# Altium schematic symbol library jlcpcb_2025_04_capacitors_extended_0805.schlib: 3281 symbols (part 2 of 18) (continued)
## 0805B561K101NT (continued)

## 0805B561K500CT
designator C?  Capacitance: 560pF  (hidden comment: *)
Capacitor, Ceramic (MLCC), 560pF, ±10%, 50V, X7R, ±10%, SMD 0805; Manufacturer: Walsin Tech Corp; Manufacturer Part Number: 0805B561K500CT; Package Size: 0805; JLCPCB Basic Part: No; JLCPCB Part Number: C123625; Supplier 1: LCSC; Category: Capacitors - MLCC; Supplier Part Number 1: C123625; Tolerance: ±10%; Voltage Rating: 50V; Temperature Coefficient: X7R; RoHS: Yes; ComponentLink1Description: Datasheet; ComponentLink1URL: https://wmsc.lcsc.com/wmsc/upload/file/pdf/v2/lcsc/2304140030_Walsin-Tech-Corp-0805B561K500CT_C123625.pdf; ComponentLink2Description: JLCPCB Part URL; ComponentLink2URL: https://jlcpcb.com/partdetail/C123625; ComponentLink3Description: LCSC Part URL; ComponentLink3URL: https://lcsc.com/product-detail/Multilayer-Ceramic-Capacitors-MLCC---SMD-SMT_Walsin-Tech-Corp-Walsin-Tech-Corp-0805B561K500CT_C123625.html
footprint CAP-0805 (0805 (2012M) Capacitor)
pins: 1, 2

## 0805B561K500NT
designator C?  Capacitance: 560pF  (hidden comment: *)
Capacitor, Ceramic (MLCC), 560pF, ±10%, 50V, X7R, ±10%, SMD 0805; Manufacturer: FH(Guangdong Fenghua Advanced Tech); Manufacturer Part Number: 0805B561K500NT; Package Size: 0805; JLCPCB Basic Part: No; JLCPCB Part Number: C1751; Supplier 1: LCSC; Category: Capacitors - MLCC; Supplier Part Number 1: C1751; Tolerance: ±10%; Voltage Rating: 50V; Temperature Coefficient: X7R; RoHS: Yes; ComponentLink1Description: Datasheet; ComponentLink1URL: https://wmsc.lcsc.com/wmsc/upload/file/pdf/v2/lcsc/2304140030_FH--Guangdong-Fenghua-Advanced-Tech-0805B561K500NT_C1751.pdf; ComponentLink2Description: JLCPCB Part URL; ComponentLink2URL: https://jlcpcb.com/partdetail/C1751; ComponentLink3Description: LCSC Part URL; ComponentLink3URL: https://lcsc.com/product-detail/Multilayer-Ceramic-Capacitors-MLCC---SMD-SMT_FH-Guangdong-Fenghua-Advanced-Tech-FH-Guangdong-Fenghua-Advanced-Tech-0805B561K500NT_C1751.html
footprint CAP-0805 (0805 (2012M) Capacitor)
pins: 1, 2

## 0805B562K101NT
designator C?  Capacitance: 5.6nF  (hidden comment: *)
Capacitor, Ceramic (MLCC), 5.6nF, ±10%, 100V, X7R, ±10%, SMD 0805; Manufacturer: FH(Guangdong Fenghua Advanced Tech); Manufacturer Part Number: 0805B562K101NT; Package Size: 0805; JLCPCB Basic Part: No; JLCPCB Part Number: C56078; Supplier 1: LCSC; Category: Capacitors - MLCC; Supplier Part Number 1: C56078; Tolerance: ±10%; Voltage Rating: 100V; Temperature Coefficient: X7R; RoHS: Yes; ComponentLink1Description: Datasheet; ComponentLink1URL: https://wmsc.lcsc.com/wmsc/upload/file/pdf/v2/lcsc/2304140030_FH--Guangdong-Fenghua-Advanced-Tech-0805B562K101NT_C56078.pdf; ComponentLink2Description: JLCPCB Part URL; ComponentLink2URL: https://jlcpcb.com/partdetail/C56078; ComponentLink3Description: LCSC Part URL; ComponentLink3URL: https://lcsc.com/product-detail/Multilayer-Ceramic-Capacitors-MLCC---SMD-SMT_FH-Guangdong-Fenghua-Advanced-Tech-FH-Guangdong-Fenghua-Advanced-Tech-0805B562K101NT_C56078.html
footprint CAP-0805 (0805 (2012M) Capacitor)
pins: 1, 2

## 0805B562K251CT
designator C?  Capacitance: 5.6nF  (hidden comment: *)
Capacitor, Ceramic (MLCC), 5.6nF, ±10%, 250V, X7R, ±10%, SMD 0805; Manufacturer: Walsin Tech Corp; Manufacturer Part Number: 0805B562K251CT; Package Size: 0805; JLCPCB Basic Part: No; JLCPCB Part Number: C152983; Supplier 1: LCSC; Category: Capacitors - MLCC; Supplier Part Number 1: C152983; Tolerance: ±10%; Voltage Rating: 250V; Temperature Coefficient: X7R; RoHS: Yes; ComponentLink1Description: Datasheet; ComponentLink1URL: https://wmsc.lcsc.com/wmsc/upload/file/pdf/v2/lcsc/2304140030_Walsin-Tech-Corp-0805B562K251CT_C152983.pdf; ComponentLink2Description: JLCPCB Part URL; ComponentLink2URL: https://jlcpcb.com/partdetail/C152983; ComponentLink3Description: LCSC Part URL; ComponentLink3URL: https://lcsc.com/product-detail/Multilayer-Ceramic-Capacitors-MLCC---SMD-SMT_Walsin-Tech-Corp-Walsin-Tech-Corp-0805B562K251CT_C152983.html
footprint CAP-0805 (0805 (2012M) Capacitor)
pins: 1, 2

## 0805B562K500CT
designator C?  Capacitance: 5.6nF  (hidden comment: *)
Capacitor, Ceramic (MLCC), 5.6nF, ±10%, 50V, X7R, ±10%, SMD 0805; Manufacturer: Walsin Tech Corp; Manufacturer Part Number: 0805B562K500CT; Package Size: 0805; JLCPCB Basic Part: No; JLCPCB Part Number: C152866; Supplier 1: LCSC; Category: Capacitors - MLCC; Supplier Part Number 1: C152866; Tolerance: ±10%; Voltage Rating: 50V; Temperature Coefficient: X7R; RoHS: Yes; ComponentLink1Description: Datasheet; ComponentLink1URL: https://wmsc.lcsc.com/wmsc/upload/file/pdf/v2/lcsc/2304140030_Walsin-Tech-Corp-0805B562K500CT_C152866.pdf; ComponentLink2Description: JLCPCB Part URL; ComponentLink2URL: https://jlcpcb.com/partdetail/C152866; ComponentLink3Description: LCSC Part URL; ComponentLink3URL: https://lcsc.com/product-detail/Multilayer-Ceramic-Capacitors-MLCC---SMD-SMT_Walsin-Tech-Corp-Walsin-Tech-Corp-0805B562K500CT_C152866.html
footprint CAP-0805 (0805 (2012M) Capacitor)
pins: 1, 2

## 0805B562K500NT
designator C?  Capacitance: 5.6nF  (hidden comment: *)
Capacitor, Ceramic (MLCC), 5.6nF, ±10%, 50V, X7R, ±10%, SMD 0805; Manufacturer: FH(Guangdong Fenghua Advanced Tech); Manufacturer Part Number: 0805B562K500NT; Package Size: 0805; JLCPCB Basic Part: No; JLCPCB Part Number: C1752; Supplier 1: LCSC; Category: Capacitors - MLCC; Supplier Part Number 1: C1752; Tolerance: ±10%; Voltage Rating: 50V; Temperature Coefficient: X7R; RoHS: Yes; ComponentLink1Description: Datasheet; ComponentLink1URL: https://wmsc.lcsc.com/wmsc/upload/file/pdf/v2/lcsc/2304140030_FH--Guangdong-Fenghua-Advanced-Tech-0805B562K500NT_C1752.pdf; ComponentLink2Description: JLCPCB Part URL; ComponentLink2URL: https://jlcpcb.com/partdetail/C1752; ComponentLink3Description: LCSC Part URL; ComponentLink3URL: https://lcsc.com/product-detail/Multilayer-Ceramic-Capacitors-MLCC---SMD-SMT_FH-Guangdong-Fenghua-Advanced-Tech-FH-Guangdong-Fenghua-Advanced-Tech-0805B562K500NT_C1752.html
footprint CAP-0805 (0805 (2012M) Capacitor)
pins: 1, 2

## 0805B562K631CT
designator C?  Capacitance: 5.6nF  (hidden comment: *)
Capacitor, Ceramic (MLCC), 5.6nF, ±10%, 630V, X7R, ±10%, SMD 0805; Manufacturer: Walsin Tech Corp; Manufacturer Part Number: 0805B562K631CT; Package Size: 0805; JLCPCB Basic Part: No; JLCPCB Part Number: C458926; Supplier 1: LCSC; Category: Capacitors - MLCC; Supplier Part Number 1: C458926; Tolerance: ±10%; Voltage Rating: 630V; Temperature Coefficient: X7R; RoHS: Yes; ComponentLink1Description: Datasheet; ComponentLink1URL: https://wmsc.lcsc.com/wmsc/upload/file/pdf/v2/lcsc/2304140030_Walsin-Tech-Corp-0805B562K631CT_C458926.pdf; ComponentLink2Description: JLCPCB Part URL; ComponentLink2URL: https://jlcpcb.com/partdetail/C458926; ComponentLink3Description: LCSC Part URL; ComponentLink3URL: https://lcsc.com/product-detail/Multilayer-Ceramic-Capacitors-MLCC---SMD-SMT_Walsin-Tech-Corp-Walsin-Tech-Corp-0805B562K631CT_C458926.html
footprint CAP-0805 (0805 (2012M) Capacitor)
pins: 1, 2

## 0805B563K500CT
designator C?  Capacitance: 56nF  (hidden comment: *)
Capacitor, Ceramic (MLCC), 56nF, ±10%, 50V, X7R, ±10%, SMD 0805; Manufacturer: Walsin Tech Corp; Manufacturer Part Number: 0805B563K500CT; Package Size: 0805; JLCPCB Basic Part: No; JLCPCB Part Number: C123626; Supplier 1: LCSC; Category: Capacitors - MLCC; Supplier Part Number 1: C123626; Tolerance: ±10%; Voltage Rating: 50V; Temperature Coefficient: X7R; RoHS: Yes; ComponentLink1Description: Datasheet; ComponentLink1URL: https://wmsc.lcsc.com/wmsc/upload/file/pdf/v2/lcsc/2304140030_Walsin-Tech-Corp-0805B563K500CT_C123626.pdf; ComponentLink2Description: JLCPCB Part URL; ComponentLink2URL: https://jlcpcb.com/partdetail/C123626; ComponentLink3Description: LCSC Part URL; ComponentLink3URL: https://lcsc.com/product-detail/Multilayer-Ceramic-Capacitors-MLCC---SMD-SMT_Walsin-Tech-Corp-Walsin-Tech-Corp-0805B563K500CT_C123626.html
footprint CAP-0805 (0805 (2012M) Capacitor)
pins: 1, 2

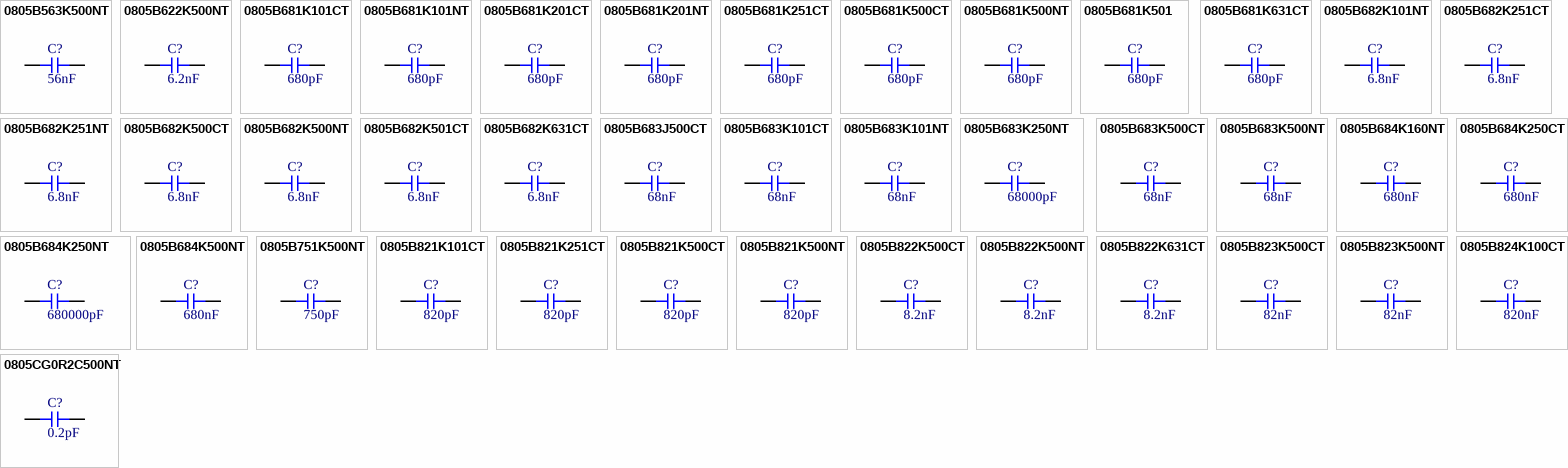
[diagram p8: symbols 0805B563K500NT to 0805CG0R2C500NT]

## 0805B563K500NT
designator C?  Capacitance: 56nF  (hidden comment: *)
Capacitor, Ceramic (MLCC), 56nF, ±10%, 50V, X7R, ±10%, SMD 0805; Manufacturer: FH(Guangdong Fenghua Advanced Tech); Manufacturer Part Number: 0805B563K500NT; Package Size: 0805; JLCPCB Basic Part: No; JLCPCB Part Number: C1753; Supplier 1: LCSC; Category: Capacitors - MLCC; Supplier Part Number 1: C1753; Tolerance: ±10%; Voltage Rating: 50V; Temperature Coefficient: X7R; RoHS: Yes; ComponentLink1Description: Datasheet; ComponentLink1URL: https://wmsc.lcsc.com/wmsc/upload/file/pdf/v2/lcsc/2304140030_FH--Guangdong-Fenghua-Advanced-Tech-0805B563K500NT_C1753.pdf; ComponentLink2Description: JLCPCB Part URL; ComponentLink2URL: https://jlcpcb.com/partdetail/C1753; ComponentLink3Description: LCSC Part URL; ComponentLink3URL: https://lcsc.com/product-detail/Multilayer-Ceramic-Capacitors-MLCC---SMD-SMT_FH-Guangdong-Fenghua-Advanced-Tech-FH-Guangdong-Fenghua-Advanced-Tech-0805B563K500NT_C1753.html
footprint CAP-0805 (0805 (2012M) Capacitor)
pins: 1, 2

## 0805B622K500NT
designator C?  Capacitance: 6.2nF  (hidden comment: *)
Capacitor, Ceramic (MLCC), 6.2nF, 50V, X7R, SMD 0805; Manufacturer: FH (Guangdong Fenghua Advanced Tech); Manufacturer Part Number: 0805B622K500NT; Package Size: 0805; JLCPCB Basic Part: No; JLCPCB Part Number: C3037648; Supplier 1: LCSC; Category: Capacitors - MLCC; Supplier Part Number 1: C3037648; Voltage Rating: 50V; Temperature Coefficient: X7R; RoHS: Yes; ComponentLink1Description: Datasheet; ComponentLink1URL: https://wmsc.lcsc.com/wmsc/upload/file/pdf/v2/lcsc/2206171645_FH--Guangdong-Fenghua-Advanced-Tech-0805B622K500NT_C3037648.pdf; ComponentLink2Description: JLCPCB Part URL; ComponentLink2URL: https://jlcpcb.com/partdetail/C3037648; ComponentLink3Description: LCSC Part URL; ComponentLink3URL: https://lcsc.com/product-detail/Multilayer-Ceramic-Capacitors-MLCC---SMD-SMT_FH-Guangdong-Fenghua-Advanced-Tech-FH-Guangdong-Fenghua-Advanced-Tech-0805B622K500NT_C3037648.html
footprint CAP-0805 (0805 (2012M) Capacitor)
pins: 1, 2

## 0805B681K101CT
designator C?  Capacitance: 680pF  (hidden comment: *)
Capacitor, Ceramic (MLCC), 680pF, ±10%, 100V, X7R, ±10%, SMD 0805; Manufacturer: Walsin Tech Corp; Manufacturer Part Number: 0805B681K101CT; Package Size: 0805; JLCPCB Basic Part: No; JLCPCB Part Number: C396732; Supplier 1: LCSC; Category: Capacitors - MLCC; Supplier Part Number 1: C396732; Tolerance: ±10%; Voltage Rating: 100V; Temperature Coefficient: X7R; RoHS: Yes; ComponentLink1Description: Datasheet; ComponentLink1URL: https://wmsc.lcsc.com/wmsc/upload/file/pdf/v2/lcsc/2304140030_Walsin-Tech-Corp-0805B681K101CT_C396732.pdf; ComponentLink2Description: JLCPCB Part URL; ComponentLink2URL: https://jlcpcb.com/partdetail/C396732; ComponentLink3Description: LCSC Part URL; ComponentLink3URL: https://lcsc.com/product-detail/Multilayer-Ceramic-Capacitors-MLCC---SMD-SMT_Walsin-Tech-Corp-Walsin-Tech-Corp-0805B681K101CT_C396732.html
footprint CAP-0805 (0805 (2012M) Capacitor)
pins: 1, 2

## 0805B681K101NT
designator C?  Capacitance: 680pF  (hidden comment: *)
Capacitor, Ceramic (MLCC), 680pF, ±10%, 100V, X7R, ±10%, SMD 0805; Manufacturer: FH (Guangdong Fenghua Advanced Tech); Manufacturer Part Number: 0805B681K101NT; Package Size: 0805; JLCPCB Basic Part: No; JLCPCB Part Number: C2991728; Supplier 1: LCSC; Category: Capacitors - MLCC; Supplier Part Number 1: C2991728; Tolerance: ±10%; Voltage Rating: 100V; Temperature Coefficient: X7R; RoHS: Yes; ComponentLink1Description: Datasheet; ComponentLink1URL: https://wmsc.lcsc.com/wmsc/upload/file/pdf/v2/lcsc/2204111630_FH--Guangdong-Fenghua-Advanced-Tech-0805B681K101NT_C2991728.pdf; ComponentLink2Description: JLCPCB Part URL; ComponentLink2URL: https://jlcpcb.com/partdetail/C2991728; ComponentLink3Description: LCSC Part URL; ComponentLink3URL: https://lcsc.com/product-detail/Multilayer-Ceramic-Capacitors-MLCC---SMD-SMT_FH-Guangdong-Fenghua-Advanced-Tech-FH-Guangdong-Fenghua-Advanced-Tech-0805B681K101NT_C2991728.html
footprint CAP-0805 (0805 (2012M) Capacitor)
pins: 1, 2

## 0805B681K201CT
designator C?  Capacitance: 680pF  (hidden comment: *)
Capacitor, Ceramic (MLCC), 680pF, ±10%, 200V, X7R, ±10%, SMD 0805; Manufacturer: Walsin Tech Corp; Manufacturer Part Number: 0805B681K201CT; Package Size: 0805; JLCPCB Basic Part: No; JLCPCB Part Number: C77479; Supplier 1: LCSC; Category: Capacitors - MLCC; Supplier Part Number 1: C77479; Tolerance: ±10%; Voltage Rating: 200V; Temperature Coefficient: X7R; RoHS: Yes; ComponentLink1Description: Datasheet; ComponentLink1URL: https://wmsc.lcsc.com/wmsc/upload/file/pdf/v2/lcsc/2304140030_Walsin-Tech-Corp-0805B681K201CT_C77479.pdf; ComponentLink2Description: JLCPCB Part URL; ComponentLink2URL: https://jlcpcb.com/partdetail/C77479; ComponentLink3Description: LCSC Part URL; ComponentLink3URL: https://lcsc.com/product-detail/Multilayer-Ceramic-Capacitors-MLCC---SMD-SMT_Walsin-Tech-Corp-Walsin-Tech-Corp-0805B681K201CT_C77479.html
footprint CAP-0805 (0805 (2012M) Capacitor)
pins: 1, 2

## 0805B681K201NT
designator C?  Capacitance: 680pF  (hidden comment: *)
Capacitor, Ceramic (MLCC), 680pF, ±10%, 200V, X7R, ±10%, SMD 0805; Manufacturer: FH (Guangdong Fenghua Advanced Tech); Manufacturer Part Number: 0805B681K201NT; Package Size: 0805; JLCPCB Basic Part: No; JLCPCB Part Number: C2991662; Supplier 1: LCSC; Category: Capacitors - MLCC; Supplier Part Number 1: C2991662; Tolerance: ±10%; Voltage Rating: 200V; Temperature Coefficient: X7R; RoHS: Yes; ComponentLink1Description: Datasheet; ComponentLink1URL: https://wmsc.lcsc.com/wmsc/upload/file/pdf/v2/lcsc/2204111630_FH--Guangdong-Fenghua-Advanced-Tech-0805B681K201NT_C2991662.pdf; ComponentLink2Description: JLCPCB Part URL; ComponentLink2URL: https://jlcpcb.com/partdetail/C2991662; ComponentLink3Description: LCSC Part URL; ComponentLink3URL: https://lcsc.com/product-detail/Multilayer-Ceramic-Capacitors-MLCC---SMD-SMT_FH-Guangdong-Fenghua-Advanced-Tech-FH-Guangdong-Fenghua-Advanced-Tech-0805B681K201NT_C2991662.html
footprint CAP-0805 (0805 (2012M) Capacitor)
pins: 1, 2

## 0805B681K251CT
designator C?  Capacitance: 680pF  (hidden comment: *)
Capacitor, Ceramic (MLCC), 680pF, ±10%, 250V, X7R, ±10%, SMD 0805; Manufacturer: Walsin Tech Corp; Manufacturer Part Number: 0805B681K251CT; Package Size: 0805; JLCPCB Basic Part: No; JLCPCB Part Number: C77480; Supplier 1: LCSC; Category: Capacitors - MLCC; Supplier Part Number 1: C77480; Tolerance: ±10%; Voltage Rating: 250V; Temperature Coefficient: X7R; RoHS: Yes; ComponentLink1Description: Datasheet; ComponentLink1URL: https://wmsc.lcsc.com/wmsc/upload/file/pdf/v2/lcsc/2304140030_Walsin-Tech-Corp-0805B681K251CT_C77480.pdf; ComponentLink2Description: JLCPCB Part URL; ComponentLink2URL: https://jlcpcb.com/partdetail/C77480; ComponentLink3Description: LCSC Part URL; ComponentLink3URL: https://lcsc.com/product-detail/Multilayer-Ceramic-Capacitors-MLCC---SMD-SMT_Walsin-Tech-Corp-Walsin-Tech-Corp-0805B681K251CT_C77480.html
footprint CAP-0805 (0805 (2012M) Capacitor)
pins: 1, 2

## 0805B681K500CT
designator C?  Capacitance: 680pF  (hidden comment: *)
Capacitor, Ceramic (MLCC), 680pF, ±10%, 50V, X7R, ±10%, SMD 0805; Manufacturer: Walsin Tech Corp; Manufacturer Part Number: 0805B681K500CT; Package Size: 0805; JLCPCB Basic Part: No; JLCPCB Part Number: C152864; Supplier 1: LCSC; Category: Capacitors - MLCC; Supplier Part Number 1: C152864; Tolerance: ±10%; Voltage Rating: 50V; Temperature Coefficient: X7R; RoHS: Yes; ComponentLink1Description: Datasheet; ComponentLink1URL: https://wmsc.lcsc.com/wmsc/upload/file/pdf/v2/lcsc/2304140030_Walsin-Tech-Corp-0805B681K500CT_C152864.pdf; ComponentLink2Description: JLCPCB Part URL; ComponentLink2URL: https://jlcpcb.com/partdetail/C152864; ComponentLink3Description: LCSC Part URL; ComponentLink3URL: https://lcsc.com/product-detail/Multilayer-Ceramic-Capacitors-MLCC---SMD-SMT_Walsin-Tech-Corp-Walsin-Tech-Corp-0805B681K500CT_C152864.html
footprint CAP-0805 (0805 (2012M) Capacitor)
pins: 1, 2

## 0805B681K500NT
designator C?  Capacitance: 680pF  (hidden comment: *)
Capacitor, Ceramic (MLCC), 680pF, ±10%, 50V, X7R, ±10%, SMD 0805; Manufacturer: FH(Guangdong Fenghua Advanced Tech); Manufacturer Part Number: 0805B681K500NT; Package Size: 0805; JLCPCB Basic Part: No; JLCPCB Part Number: C1754; Supplier 1: LCSC; Category: Capacitors - MLCC; Supplier Part Number 1: C1754; Tolerance: ±10%; Voltage Rating: 50V; Temperature Coefficient: X7R; RoHS: Yes; ComponentLink1Description: Datasheet; ComponentLink1URL: https://wmsc.lcsc.com/wmsc/upload/file/pdf/v2/lcsc/2304140030_FH--Guangdong-Fenghua-Advanced-Tech-0805B681K500NT_C1754.pdf; ComponentLink2Description: JLCPCB Part URL; ComponentLink2URL: https://jlcpcb.com/partdetail/C1754; ComponentLink3Description: LCSC Part URL; ComponentLink3URL: https://lcsc.com/product-detail/Multilayer-Ceramic-Capacitors-MLCC---SMD-SMT_FH-Guangdong-Fenghua-Advanced-Tech-FH-Guangdong-Fenghua-Advanced-Tech-0805B681K500NT_C1754.html
footprint CAP-0805 (0805 (2012M) Capacitor)
pins: 1, 2

## 0805B681K501
designator C?  Capacitance: 680pF  (hidden comment: *)
Capacitor, Ceramic (MLCC), 680pF, ±10%, 500V, X7R, ±10%, SMD 0805; Manufacturer: Walsin Tech Corp; Manufacturer Part Number: 0805B681K501; Package Size: 0805; JLCPCB Basic Part: No; JLCPCB Part Number: C152982; Supplier 1: LCSC; Category: Capacitors - MLCC; Supplier Part Number 1: C152982; Tolerance: ±10%; Voltage Rating: 500V; Temperature Coefficient: X7R; RoHS: Yes; ComponentLink1Description: Datasheet; ComponentLink1URL: https://wmsc.lcsc.com/wmsc/upload/file/pdf/v2/lcsc/2304140030_Walsin-Tech-Corp-0805B681K501_C152982.pdf; ComponentLink2Description: JLCPCB Part URL; ComponentLink2URL: https://jlcpcb.com/partdetail/C152982; ComponentLink3Description: LCSC Part URL; ComponentLink3URL: https://lcsc.com/product-detail/Multilayer-Ceramic-Capacitors-MLCC---SMD-SMT_Walsin-Tech-Corp-Walsin-Tech-Corp-0805B681K501_C152982.html
footprint CAP-0805 (0805 (2012M) Capacitor)
pins: 1, 2

## 0805B681K631CT
designator C?  Capacitance: 680pF  (hidden comment: *)
Capacitor, Ceramic (MLCC), 680pF, ±10%, 630V, X7R, ±10%, SMD 0805; Manufacturer: Walsin Tech Corp; Manufacturer Part Number: 0805B681K631CT; Package Size: 0805; JLCPCB Basic Part: No; JLCPCB Part Number: C3859169; Supplier 1: LCSC; Category: Capacitors - MLCC; Supplier Part Number 1: C3859169; Tolerance: ±10%; Voltage Rating: 630V; Temperature Coefficient: X7R; RoHS: Yes; ComponentLink1Description: Datasheet; ComponentLink1URL: https://wmsc.lcsc.com/wmsc/upload/file/pdf/v2/lcsc/2309201537_Walsin-Tech-Corp-0805B681K631CT_C3859169.pdf; ComponentLink2Description: JLCPCB Part URL; ComponentLink2URL: https://jlcpcb.com/partdetail/C3859169; ComponentLink3Description: LCSC Part URL; ComponentLink3URL: https://lcsc.com/product-detail/Multilayer-Ceramic-Capacitors-MLCC---SMD-SMT_Walsin-Tech-Corp-Walsin-Tech-Corp-0805B681K631CT_C3859169.html
footprint CAP-0805 (0805 (2012M) Capacitor)
pins: 1, 2

## 0805B682K101NT
designator C?  Capacitance: 6.8nF  (hidden comment: *)
Capacitor, Ceramic (MLCC), 6.8nF, ±10%, 100V, X7R, ±10%, SMD 0805; Manufacturer: FH(Guangdong Fenghua Advanced Tech); Manufacturer Part Number: 0805B682K101NT; Package Size: 0805; JLCPCB Basic Part: No; JLCPCB Part Number: C313092; Supplier 1: LCSC; Category: Capacitors - MLCC; Supplier Part Number 1: C313092; Tolerance: ±10%; Voltage Rating: 100V; Temperature Coefficient: X7R; RoHS: Yes; ComponentLink1Description: Datasheet; ComponentLink1URL: https://wmsc.lcsc.com/wmsc/upload/file/pdf/v2/lcsc/2304140030_FH--Guangdong-Fenghua-Advanced-Tech-0805B682K101NT_C313092.pdf; ComponentLink2Description: JLCPCB Part URL; ComponentLink2URL: https://jlcpcb.com/partdetail/C313092; ComponentLink3Description: LCSC Part URL; ComponentLink3URL: https://lcsc.com/product-detail/Multilayer-Ceramic-Capacitors-MLCC---SMD-SMT_FH-Guangdong-Fenghua-Advanced-Tech-FH-Guangdong-Fenghua-Advanced-Tech-0805B682K101NT_C313092.html
footprint CAP-0805 (0805 (2012M) Capacitor)
pins: 1, 2

## 0805B682K251CT
designator C?  Capacitance: 6.8nF  (hidden comment: *)
Capacitor, Ceramic (MLCC), 6.8nF, ±10%, 250V, X7R, ±10%, SMD 0805; Manufacturer: Walsin Tech Corp; Manufacturer Part Number: 0805B682K251CT; Package Size: 0805; JLCPCB Basic Part: No; JLCPCB Part Number: C396734; Supplier 1: LCSC; Category: Capacitors - MLCC; Supplier Part Number 1: C396734; Tolerance: ±10%; Voltage Rating: 250V; Temperature Coefficient: X7R; RoHS: Yes; ComponentLink1Description: Datasheet; ComponentLink1URL: https://wmsc.lcsc.com/wmsc/upload/file/pdf/v2/lcsc/2304140030_Walsin-Tech-Corp-0805B682K251CT_C396734.pdf; ComponentLink2Description: JLCPCB Part URL; ComponentLink2URL: https://jlcpcb.com/partdetail/C396734; ComponentLink3Description: LCSC Part URL; ComponentLink3URL: https://lcsc.com/product-detail/Multilayer-Ceramic-Capacitors-MLCC---SMD-SMT_Walsin-Tech-Corp-Walsin-Tech-Corp-0805B682K251CT_C396734.html
footprint CAP-0805 (0805 (2012M) Capacitor)
pins: 1, 2

## 0805B682K251NT
designator C?  Capacitance: 6.8nF  (hidden comment: *)
Capacitor, Ceramic (MLCC), 6.8nF, ±10%, 250V, ±10%, SMD 0805; Manufacturer: FH(Guangdong Fenghua Advanced Tech); Manufacturer Part Number: 0805B682K251NT; Package Size: 0805; JLCPCB Basic Part: No; JLCPCB Part Number: C1322375; Supplier 1: LCSC; Category: Capacitors - MLCC; Supplier Part Number 1: C1322375; Tolerance: ±10%; Voltage Rating: 250V; RoHS: Yes; ComponentLink1Description: Datasheet; ComponentLink1URL: https://wmsc.lcsc.com/wmsc/upload/file/pdf/v2/lcsc/2304140030_FH--Guangdong-Fenghua-Advanced-Tech-0805B682K251NT_C1322375.pdf; ComponentLink2Description: JLCPCB Part URL; ComponentLink2URL: https://jlcpcb.com/partdetail/C1322375; ComponentLink3Description: LCSC Part URL; ComponentLink3URL: https://lcsc.com/product-detail/Multilayer-Ceramic-Capacitors-MLCC---SMD-SMT_FH-Guangdong-Fenghua-Advanced-Tech-FH-Guangdong-Fenghua-Advanced-Tech-0805B682K251NT_C1322375.html
footprint CAP-0805 (0805 (2012M) Capacitor)
pins: 1, 2

## 0805B682K500CT
designator C?  Capacitance: 6.8nF  (hidden comment: *)
Capacitor, Ceramic (MLCC), 6.8nF, ±10%, 50V, X7R, ±10%, SMD 0805; Manufacturer: Walsin Tech Corp; Manufacturer Part Number: 0805B682K500CT; Package Size: 0805; JLCPCB Basic Part: No; JLCPCB Part Number: C152863; Supplier 1: LCSC; Category: Capacitors - MLCC; Supplier Part Number 1: C152863; Tolerance: ±10%; Voltage Rating: 50V; Temperature Coefficient: X7R; RoHS: Yes; ComponentLink1Description: Datasheet; ComponentLink1URL: https://wmsc.lcsc.com/wmsc/upload/file/pdf/v2/lcsc/2304140030_Walsin-Tech-Corp-0805B682K500CT_C152863.pdf; ComponentLink2Description: JLCPCB Part URL; ComponentLink2URL: https://jlcpcb.com/partdetail/C152863; ComponentLink3Description: LCSC Part URL; ComponentLink3URL: https://lcsc.com/product-detail/Multilayer-Ceramic-Capacitors-MLCC---SMD-SMT_Walsin-Tech-Corp-Walsin-Tech-Corp-0805B682K500CT_C152863.html
footprint CAP-0805 (0805 (2012M) Capacitor)
pins: 1, 2

## 0805B682K500NT
designator C?  Capacitance: 6.8nF  (hidden comment: *)
Capacitor, Ceramic (MLCC), 6.8nF, ±10%, 50V, X7R, ±10%, SMD 0805; Manufacturer: FH(Guangdong Fenghua Advanced Tech); Manufacturer Part Number: 0805B682K500NT; Package Size: 0805; JLCPCB Basic Part: No; JLCPCB Part Number: C1755; Supplier 1: LCSC; Category: Capacitors - MLCC; Supplier Part Number 1: C1755; Tolerance: ±10%; Voltage Rating: 50V; Temperature Coefficient: X7R; RoHS: Yes; ComponentLink1Description: Datasheet; ComponentLink1URL: https://wmsc.lcsc.com/wmsc/upload/file/pdf/v2/lcsc/2304140030_FH--Guangdong-Fenghua-Advanced-Tech-0805B682K500NT_C1755.pdf; ComponentLink2Description: JLCPCB Part URL; ComponentLink2URL: https://jlcpcb.com/partdetail/C1755; ComponentLink3Description: LCSC Part URL; ComponentLink3URL: https://lcsc.com/product-detail/Multilayer-Ceramic-Capacitors-MLCC---SMD-SMT_FH-Guangdong-Fenghua-Advanced-Tech-FH-Guangdong-Fenghua-Advanced-Tech-0805B682K500NT_C1755.html
footprint CAP-0805 (0805 (2012M) Capacitor)
pins: 1, 2

## 0805B682K501CT
designator C?  Capacitance: 6.8nF  (hidden comment: *)
Capacitor, Ceramic (MLCC), 6.8nF, ±10%, 500V, X7R, ±10%, SMD 0805; Manufacturer: Walsin Tech Corp; Manufacturer Part Number: 0805B682K501CT; Package Size: 0805; JLCPCB Basic Part: No; JLCPCB Part Number: C458927; Supplier 1: LCSC; Category: Capacitors - MLCC; Supplier Part Number 1: C458927; Tolerance: ±10%; Voltage Rating: 500V; Temperature Coefficient: X7R; RoHS: Yes; ComponentLink1Description: Datasheet; ComponentLink1URL: https://wmsc.lcsc.com/wmsc/upload/file/pdf/v2/lcsc/2304140030_Walsin-Tech-Corp-0805B682K501CT_C458927.pdf; ComponentLink2Description: JLCPCB Part URL; ComponentLink2URL: https://jlcpcb.com/partdetail/C458927; ComponentLink3Description: LCSC Part URL; ComponentLink3URL: https://lcsc.com/product-detail/Multilayer-Ceramic-Capacitors-MLCC---SMD-SMT_Walsin-Tech-Corp-Walsin-Tech-Corp-0805B682K501CT_C458927.html
footprint CAP-0805 (0805 (2012M) Capacitor)
pins: 1, 2

## 0805B682K631CT
designator C?  Capacitance: 6.8nF  (hidden comment: *)
Capacitor, Ceramic (MLCC), 6.8nF, ±10%, 630V, X7R, ±10%, SMD 0805; Manufacturer: Walsin Tech Corp; Manufacturer Part Number: 0805B682K631CT; Package Size: 0805; JLCPCB Basic Part: No; JLCPCB Part Number: C303912; Supplier 1: LCSC; Category: Capacitors - MLCC; Supplier Part Number 1: C303912; Tolerance: ±10%; Voltage Rating: 630V; Temperature Coefficient: X7R; RoHS: Yes; ComponentLink1Description: Datasheet; ComponentLink2Description: JLCPCB Part URL; ComponentLink2URL: https://jlcpcb.com/partdetail/C303912; ComponentLink3Description: LCSC Part URL; ComponentLink3URL: https://lcsc.com/product-detail/Multilayer-Ceramic-Capacitors-MLCC---SMD-SMT_Walsin-Tech-Corp-Walsin-Tech-Corp-0805B682K631CT_C303912.html
footprint CAP-0805 (0805 (2012M) Capacitor)
pins: 1, 2

## 0805B683J500CT
designator C?  Capacitance: 68nF  (hidden comment: *)
Capacitor, Ceramic (MLCC), 68nF, ±5%, 50V, X7R, ±5%, SMD 0805; Manufacturer: Walsin Tech Corp; Manufacturer Part Number: 0805B683J500CT; Package Size: 0805; JLCPCB Basic Part: No; JLCPCB Part Number: C2918546; Supplier 1: LCSC; Category: Capacitors - MLCC; Supplier Part Number 1: C2918546; Tolerance: ±5%; Voltage Rating: 50V; Temperature Coefficient: X7R; RoHS: Yes; ComponentLink1Description: Datasheet; ComponentLink1URL: https://wmsc.lcsc.com/wmsc/upload/file/pdf/v2/lcsc/2111171830_Walsin-Tech-Corp-0805B683J500CT_C2918546.pdf; ComponentLink2Description: JLCPCB Part URL; ComponentLink2URL: https://jlcpcb.com/partdetail/C2918546; ComponentLink3Description: LCSC Part URL; ComponentLink3URL: https://lcsc.com/product-detail/Multilayer-Ceramic-Capacitors-MLCC---SMD-SMT_Walsin-Tech-Corp-Walsin-Tech-Corp-0805B683J500CT_C2918546.html
footprint CAP-0805 (0805 (2012M) Capacitor)
pins: 1, 2

## 0805B683K101CT
designator C?  Capacitance: 68nF  (hidden comment: *)
Capacitor, Ceramic (MLCC), 68nF, ±10%, 100V, X7R, ±10%, SMD 0805; Manufacturer: Walsin Tech Corp; Manufacturer Part Number: 0805B683K101CT; Package Size: 0805; JLCPCB Basic Part: No; JLCPCB Part Number: C303913; Supplier 1: LCSC; Category: Capacitors - MLCC; Supplier Part Number 1: C303913; Tolerance: ±10%; Voltage Rating: 100V; Temperature Coefficient: X7R; RoHS: Yes; ComponentLink1Description: Datasheet; ComponentLink2Description: JLCPCB Part URL; ComponentLink2URL: https://jlcpcb.com/partdetail/C303913; ComponentLink3Description: LCSC Part URL; ComponentLink3URL: https://lcsc.com/product-detail/Multilayer-Ceramic-Capacitors-MLCC---SMD-SMT_Walsin-Tech-Corp-Walsin-Tech-Corp-0805B683K101CT_C303913.html
footprint CAP-0805 (0805 (2012M) Capacitor)
pins: 1, 2

## 0805B683K101NT
designator C?  Capacitance: 68nF  (hidden comment: *)
Capacitor, Ceramic (MLCC), 68nF, ±10%, 100V, X7R, ±10%, SMD 0805; Manufacturer: FH(Guangdong Fenghua Advanced Tech); Manufacturer Part Number: 0805B683K101NT; Package Size: 0805; JLCPCB Basic Part: No; JLCPCB Part Number: C574053; Supplier 1: LCSC; Category: Capacitors - MLCC; Supplier Part Number 1: C574053; Tolerance: ±10%; Voltage Rating: 100V; Temperature Coefficient: X7R; RoHS: Yes; ComponentLink1Description: Datasheet; ComponentLink1URL: https://wmsc.lcsc.com/wmsc/upload/file/pdf/v2/lcsc/2304140030_FH--Guangdong-Fenghua-Advanced-Tech-0805B683K101NT_C574053.pdf; ComponentLink2Description: JLCPCB Part URL; ComponentLink2URL: https://jlcpcb.com/partdetail/C574053; ComponentLink3Description: LCSC Part URL; ComponentLink3URL: https://lcsc.com/product-detail/Multilayer-Ceramic-Capacitors-MLCC---SMD-SMT_FH-Guangdong-Fenghua-Advanced-Tech-FH-Guangdong-Fenghua-Advanced-Tech-0805B683K101NT_C574053.html
footprint CAP-0805 (0805 (2012M) Capacitor)
pins: 1, 2

## 0805B683K250NT
designator C?  Capacitance: 68000pF  (hidden comment: *)
Capacitor, Ceramic (MLCC), 68000pF, ±10%, 25V, X7R, ±10%, SMD 0805; Manufacturer: FH (Guangdong Fenghua Advanced Tech); Manufacturer Part Number: 0805B683K250NT; Package Size: 0805; JLCPCB Basic Part: No; JLCPCB Part Number: C880305; Supplier 1: LCSC; Category: Capacitors - MLCC; Supplier Part Number 1: C880305; Tolerance: ±10%; Voltage Rating: 25V; Temperature Coefficient: X7R; RoHS: Yes; ComponentLink1Description: Datasheet; ComponentLink1URL: https://wmsc.lcsc.com/wmsc/upload/file/pdf/v2/lcsc/2304140030_FH--Guangdong-Fenghua-Advanced-Tech-0805B683K250NT_C880305.pdf; ComponentLink2Description: JLCPCB Part URL; ComponentLink2URL: https://jlcpcb.com/partdetail/C880305; ComponentLink3Description: LCSC Part URL; ComponentLink3URL: https://lcsc.com/product-detail/Multilayer-Ceramic-Capacitors-MLCC---SMD-SMT_FH-Guangdong-Fenghua-Advanced-Tech-FH-Guangdong-Fenghua-Advanced-Tech-0805B683K250NT_C880305.html
footprint CAP-0805 (0805 (2012M) Capacitor)
pins: 1, 2

## 0805B683K500CT
designator C?  Capacitance: 68nF  (hidden comment: *)
Capacitor, Ceramic (MLCC), 68nF, ±10%, 50V, X7R, ±10%, SMD 0805; Manufacturer: Walsin Tech Corp; Manufacturer Part Number: 0805B683K500CT; Package Size: 0805; JLCPCB Basic Part: No; JLCPCB Part Number: C123627; Supplier 1: LCSC; Category: Capacitors - MLCC; Supplier Part Number 1: C123627; Tolerance: ±10%; Voltage Rating: 50V; Temperature Coefficient: X7R; RoHS: Yes; ComponentLink1Description: Datasheet; ComponentLink1URL: https://wmsc.lcsc.com/wmsc/upload/file/pdf/v2/lcsc/2304140030_Walsin-Tech-Corp-0805B683K500CT_C123627.pdf; ComponentLink2Description: JLCPCB Part URL; ComponentLink2URL: https://jlcpcb.com/partdetail/C123627; ComponentLink3Description: LCSC Part URL; ComponentLink3URL: https://lcsc.com/product-detail/Multilayer-Ceramic-Capacitors-MLCC---SMD-SMT_Walsin-Tech-Corp-Walsin-Tech-Corp-0805B683K500CT_C123627.html
footprint CAP-0805 (0805 (2012M) Capacitor)
pins: 1, 2

## 0805B683K500NT
designator C?  Capacitance: 68nF  (hidden comment: *)
Capacitor, Ceramic (MLCC), 68nF, ±10%, 50V, X7R, ±10%, SMD 0805; Manufacturer: FH(Guangdong Fenghua Advanced Tech); Manufacturer Part Number: 0805B683K500NT; Package Size: 0805; JLCPCB Basic Part: No; JLCPCB Part Number: C1756; Supplier 1: LCSC; Category: Capacitors - MLCC; Supplier Part Number 1: C1756; Tolerance: ±10%; Voltage Rating: 50V; Temperature Coefficient: X7R; RoHS: Yes; ComponentLink1Description: Datasheet; ComponentLink1URL: https://wmsc.lcsc.com/wmsc/upload/file/pdf/v2/lcsc/2304140030_FH--Guangdong-Fenghua-Advanced-Tech-0805B683K500NT_C1756.pdf; ComponentLink2Description: JLCPCB Part URL; ComponentLink2URL: https://jlcpcb.com/partdetail/C1756; ComponentLink3Description: LCSC Part URL; ComponentLink3URL: https://lcsc.com/product-detail/Multilayer-Ceramic-Capacitors-MLCC---SMD-SMT_FH-Guangdong-Fenghua-Advanced-Tech-FH-Guangdong-Fenghua-Advanced-Tech-0805B683K500NT_C1756.html
footprint CAP-0805 (0805 (2012M) Capacitor)
pins: 1, 2

## 0805B684K160NT
designator C?  Capacitance: 680nF  (hidden comment: *)
Capacitor, Ceramic (MLCC), 680nF, ±10%, 16V, X7R, ±10%, SMD 0805; Manufacturer: FH(Guangdong Fenghua Advanced Tech); Manufacturer Part Number: 0805B684K160NT; Package Size: 0805; JLCPCB Basic Part: No; JLCPCB Part Number: C880262; Supplier 1: LCSC; Category: Capacitors - MLCC; Supplier Part Number 1: C880262; Tolerance: ±10%; Voltage Rating: 16V; Temperature Coefficient: X7R; RoHS: Yes; ComponentLink1Description: Datasheet; ComponentLink1URL: https://wmsc.lcsc.com/wmsc/upload/file/pdf/v2/lcsc/2304140030_FH--Guangdong-Fenghua-Advanced-Tech-0805B684K160NT_C880262.pdf; ComponentLink2Description: JLCPCB Part URL; ComponentLink2URL: https://jlcpcb.com/partdetail/C880262; ComponentLink3Description: LCSC Part URL; ComponentLink3URL: https://lcsc.com/product-detail/Multilayer-Ceramic-Capacitors-MLCC---SMD-SMT_FH-Guangdong-Fenghua-Advanced-Tech-FH-Guangdong-Fenghua-Advanced-Tech-0805B684K160NT_C880262.html
footprint CAP-0805 (0805 (2012M) Capacitor)
pins: 1, 2

## 0805B684K250CT
designator C?  Capacitance: 680nF  (hidden comment: *)
Capacitor, Ceramic (MLCC), 680nF, ±10%, 25V, X7R, ±10%, SMD 0805; Manufacturer: Walsin Tech Corp; Manufacturer Part Number: 0805B684K250CT; Package Size: 0805; JLCPCB Basic Part: No; JLCPCB Part Number: C237235; Supplier 1: LCSC; Category: Capacitors - MLCC; Supplier Part Number 1: C237235; Tolerance: ±10%; Voltage Rating: 25V; Temperature Coefficient: X7R; RoHS: Yes; ComponentLink1Description: Datasheet; ComponentLink1URL: https://wmsc.lcsc.com/wmsc/upload/file/pdf/v2/lcsc/2304140030_Walsin-Tech-Corp-0805B684K250CT_C237235.pdf; ComponentLink2Description: JLCPCB Part URL; ComponentLink2URL: https://jlcpcb.com/partdetail/C237235; ComponentLink3Description: LCSC Part URL; ComponentLink3URL: https://lcsc.com/product-detail/Multilayer-Ceramic-Capacitors-MLCC---SMD-SMT_Walsin-Tech-Corp-Walsin-Tech-Corp-0805B684K250CT_C237235.html
footprint CAP-0805 (0805 (2012M) Capacitor)
pins: 1, 2

## 0805B684K250NT
designator C?  Capacitance: 680000pF  (hidden comment: *)
Capacitor, Ceramic (MLCC), 680000pF, ±10%, 25V, X7R, ±10%, SMD 0805; Manufacturer: FH (Guangdong Fenghua Advanced Tech); Manufacturer Part Number: 0805B684K250NT; Package Size: 0805; JLCPCB Basic Part: No; JLCPCB Part Number: C2857995; Supplier 1: LCSC; Category: Capacitors - MLCC; Supplier Part Number 1: C2857995; Tolerance: ±10%; Voltage Rating: 25V; Temperature Coefficient: X7R; RoHS: Yes; ComponentLink1Description: Datasheet; ComponentLink2Description: JLCPCB Part URL; ComponentLink2URL: https://jlcpcb.com/partdetail/C2857995; ComponentLink3Description: LCSC Part URL; ComponentLink3URL: https://lcsc.com/product-detail/Multilayer-Ceramic-Capacitors-MLCC---SMD-SMT_FH-Guangdong-Fenghua-Advanced-Tech-FH-Guangdong-Fenghua-Advanced-Tech-0805B684K250NT_C2857995.html
footprint CAP-0805 (0805 (2012M) Capacitor)
pins: 1, 2

## 0805B684K500NT
designator C?  Capacitance: 680nF  (hidden comment: *)
Capacitor, Ceramic (MLCC), 680nF, ±10%, 50V, ±10%, SMD 0805; Manufacturer: FH (Guangdong Fenghua Advanced Tech); Manufacturer Part Number: 0805B684K500NT; Package Size: 0805; JLCPCB Basic Part: No; JLCPCB Part Number: C967581; Supplier 1: LCSC; Category: Capacitors - MLCC; Supplier Part Number 1: C967581; Tolerance: ±10%; Voltage Rating: 50V; RoHS: Yes; ComponentLink1Description: Datasheet; ComponentLink1URL: https://wmsc.lcsc.com/wmsc/upload/file/pdf/v2/lcsc/2304140030_FH--Guangdong-Fenghua-Advanced-Tech-0805B684K500NT_C967581.pdf; ComponentLink2Description: JLCPCB Part URL; ComponentLink2URL: https://jlcpcb.com/partdetail/C967581; ComponentLink3Description: LCSC Part URL; ComponentLink3URL: https://lcsc.com/product-detail/Multilayer-Ceramic-Capacitors-MLCC---SMD-SMT_FH-Guangdong-Fenghua-Advanced-Tech-FH-Guangdong-Fenghua-Advanced-Tech-0805B684K500NT_C967581.html
footprint CAP-0805 (0805 (2012M) Capacitor)
pins: 1, 2

## 0805B751K500NT
designator C?  Capacitance: 750pF  (hidden comment: *)
Capacitor, Ceramic (MLCC), 750pF, ±10%, 50V, X7R, ±10%, SMD 0805; Manufacturer: FH(Guangdong Fenghua Advanced Tech); Manufacturer Part Number: 0805B751K500NT; Package Size: 0805; JLCPCB Basic Part: No; JLCPCB Part Number: C27244; Supplier 1: LCSC; Category: Capacitors - MLCC; Supplier Part Number 1: C27244; Tolerance: ±10%; Voltage Rating: 50V; Temperature Coefficient: X7R; RoHS: Yes; ComponentLink1Description: Datasheet; ComponentLink1URL: https://wmsc.lcsc.com/wmsc/upload/file/pdf/v2/lcsc/2304140030_FH--Guangdong-Fenghua-Advanced-Tech-0805B751K500NT_C27244.pdf; ComponentLink2Description: JLCPCB Part URL; ComponentLink2URL: https://jlcpcb.com/partdetail/C27244; ComponentLink3Description: LCSC Part URL; ComponentLink3URL: https://lcsc.com/product-detail/Multilayer-Ceramic-Capacitors-MLCC---SMD-SMT_FH-Guangdong-Fenghua-Advanced-Tech-FH-Guangdong-Fenghua-Advanced-Tech-0805B751K500NT_C27244.html
footprint CAP-0805 (0805 (2012M) Capacitor)
pins: 1, 2

## 0805B821K101CT
designator C?  Capacitance: 820pF  (hidden comment: *)
Capacitor, Ceramic (MLCC), 820pF, ±10%, 100V, X7R, ±10%, SMD 0805; Manufacturer: Walsin Tech Corp; Manufacturer Part Number: 0805B821K101CT; Package Size: 0805; JLCPCB Basic Part: No; JLCPCB Part Number: C458928; Supplier 1: LCSC; Category: Capacitors - MLCC; Supplier Part Number 1: C458928; Tolerance: ±10%; Voltage Rating: 100V; Temperature Coefficient: X7R; RoHS: Yes; ComponentLink1Description: Datasheet; ComponentLink1URL: https://wmsc.lcsc.com/wmsc/upload/file/pdf/v2/lcsc/2304140030_Walsin-Tech-Corp-0805B821K101CT_C458928.pdf; ComponentLink2Description: JLCPCB Part URL; ComponentLink2URL: https://jlcpcb.com/partdetail/C458928; ComponentLink3Description: LCSC Part URL; ComponentLink3URL: https://lcsc.com/product-detail/Multilayer-Ceramic-Capacitors-MLCC---SMD-SMT_Walsin-Tech-Corp-Walsin-Tech-Corp-0805B821K101CT_C458928.html
footprint CAP-0805 (0805 (2012M) Capacitor)
pins: 1, 2

## 0805B821K251CT
designator C?  Capacitance: 820pF  (hidden comment: *)
Capacitor, Ceramic (MLCC), 820pF, ±10%, 250V, X7R, ±10%, SMD 0805; Manufacturer: Walsin Tech Corp; Manufacturer Part Number: 0805B821K251CT; Package Size: 0805; JLCPCB Basic Part: No; JLCPCB Part Number: C384750; Supplier 1: LCSC; Category: Capacitors - MLCC; Supplier Part Number 1: C384750; Tolerance: ±10%; Voltage Rating: 250V; Temperature Coefficient: X7R; RoHS: Yes; ComponentLink1Description: Datasheet; ComponentLink1URL: https://wmsc.lcsc.com/wmsc/upload/file/pdf/v2/lcsc/2304140030_Walsin-Tech-Corp-0805B821K251CT_C384750.pdf; ComponentLink2Description: JLCPCB Part URL; ComponentLink2URL: https://jlcpcb.com/partdetail/C384750; ComponentLink3Description: LCSC Part URL; ComponentLink3URL: https://lcsc.com/product-detail/Multilayer-Ceramic-Capacitors-MLCC---SMD-SMT_Walsin-Tech-Corp-Walsin-Tech-Corp-0805B821K251CT_C384750.html
footprint CAP-0805 (0805 (2012M) Capacitor)
pins: 1, 2

## 0805B821K500CT
designator C?  Capacitance: 820pF  (hidden comment: *)
Capacitor, Ceramic (MLCC), 820pF, ±10%, 50V, X7R, ±10%, SMD 0805; Manufacturer: Walsin Tech Corp; Manufacturer Part Number: 0805B821K500CT; Package Size: 0805; JLCPCB Basic Part: No; JLCPCB Part Number: C152862; Supplier 1: LCSC; Category: Capacitors - MLCC; Supplier Part Number 1: C152862; Tolerance: ±10%; Voltage Rating: 50V; Temperature Coefficient: X7R; RoHS: Yes; ComponentLink1Description: Datasheet; ComponentLink1URL: https://wmsc.lcsc.com/wmsc/upload/file/pdf/v2/lcsc/2304140030_Walsin-Tech-Corp-0805B821K500CT_C152862.pdf; ComponentLink2Description: JLCPCB Part URL; ComponentLink2URL: https://jlcpcb.com/partdetail/C152862; ComponentLink3Description: LCSC Part URL; ComponentLink3URL: https://lcsc.com/product-detail/Multilayer-Ceramic-Capacitors-MLCC---SMD-SMT_Walsin-Tech-Corp-Walsin-Tech-Corp-0805B821K500CT_C152862.html
footprint CAP-0805 (0805 (2012M) Capacitor)
pins: 1, 2

## 0805B821K500NT
designator C?  Capacitance: 820pF  (hidden comment: *)
Capacitor, Ceramic (MLCC), 820pF, ±10%, 50V, X7R, ±10%, SMD 0805; Manufacturer: FH(Guangdong Fenghua Advanced Tech); Manufacturer Part Number: 0805B821K500NT; Package Size: 0805; JLCPCB Basic Part: No; JLCPCB Part Number: C1757; Supplier 1: LCSC; Category: Capacitors - MLCC; Supplier Part Number 1: C1757; Tolerance: ±10%; Voltage Rating: 50V; Temperature Coefficient: X7R; RoHS: Yes; ComponentLink1Description: Datasheet; ComponentLink1URL: https://wmsc.lcsc.com/wmsc/upload/file/pdf/v2/lcsc/2304140030_FH--Guangdong-Fenghua-Advanced-Tech-0805B821K500NT_C1757.pdf; ComponentLink2Description: JLCPCB Part URL; ComponentLink2URL: https://jlcpcb.com/partdetail/C1757; ComponentLink3Description: LCSC Part URL; ComponentLink3URL: https://lcsc.com/product-detail/Multilayer-Ceramic-Capacitors-MLCC---SMD-SMT_FH-Guangdong-Fenghua-Advanced-Tech-FH-Guangdong-Fenghua-Advanced-Tech-0805B821K500NT_C1757.html
footprint CAP-0805 (0805 (2012M) Capacitor)
pins: 1, 2

## 0805B822K500CT
designator C?  Capacitance: 8.2nF  (hidden comment: *)
Capacitor, Ceramic (MLCC), 8.2nF, ±10%, 50V, X7R, ±10%, SMD 0805; Manufacturer: Walsin Tech Corp; Manufacturer Part Number: 0805B822K500CT; Package Size: 0805; JLCPCB Basic Part: No; JLCPCB Part Number: C123628; Supplier 1: LCSC; Category: Capacitors - MLCC; Supplier Part Number 1: C123628; Tolerance: ±10%; Voltage Rating: 50V; Temperature Coefficient: X7R; RoHS: Yes; ComponentLink1Description: Datasheet; ComponentLink1URL: https://wmsc.lcsc.com/wmsc/upload/file/pdf/v2/lcsc/2304140030_Walsin-Tech-Corp-0805B822K500CT_C123628.pdf; ComponentLink2Description: JLCPCB Part URL; ComponentLink2URL: https://jlcpcb.com/partdetail/C123628; ComponentLink3Description: LCSC Part URL; ComponentLink3URL: https://lcsc.com/product-detail/Multilayer-Ceramic-Capacitors-MLCC---SMD-SMT_Walsin-Tech-Corp-Walsin-Tech-Corp-0805B822K500CT_C123628.html
footprint CAP-0805 (0805 (2012M) Capacitor)
pins: 1, 2

## 0805B822K500NT
designator C?  Capacitance: 8.2nF  (hidden comment: *)
Capacitor, Ceramic (MLCC), 8.2nF, ±10%, 50V, X7R, ±10%, SMD 0805; Manufacturer: FH(Guangdong Fenghua Advanced Tech); Manufacturer Part Number: 0805B822K500NT; Package Size: 0805; JLCPCB Basic Part: No; JLCPCB Part Number: C1758; Supplier 1: LCSC; Category: Capacitors - MLCC; Supplier Part Number 1: C1758; Tolerance: ±10%; Voltage Rating: 50V; Temperature Coefficient: X7R; RoHS: Yes; ComponentLink1Description: Datasheet; ComponentLink1URL: https://wmsc.lcsc.com/wmsc/upload/file/pdf/v2/lcsc/2304140030_FH--Guangdong-Fenghua-Advanced-Tech-0805B822K500NT_C1758.pdf; ComponentLink2Description: JLCPCB Part URL; ComponentLink2URL: https://jlcpcb.com/partdetail/C1758; ComponentLink3Description: LCSC Part URL; ComponentLink3URL: https://lcsc.com/product-detail/Multilayer-Ceramic-Capacitors-MLCC---SMD-SMT_FH-Guangdong-Fenghua-Advanced-Tech-FH-Guangdong-Fenghua-Advanced-Tech-0805B822K500NT_C1758.html
footprint CAP-0805 (0805 (2012M) Capacitor)
pins: 1, 2

## 0805B822K631CT
designator C?  Capacitance: 8.2nF  (hidden comment: *)
Capacitor, Ceramic (MLCC), 8.2nF, ±10%, 630V, X7R, ±10%, SMD 0805; Manufacturer: Walsin Tech Corp; Manufacturer Part Number: 0805B822K631CT; Package Size: 0805; JLCPCB Basic Part: No; JLCPCB Part Number: C458929; Supplier 1: LCSC; Category: Capacitors - MLCC; Supplier Part Number 1: C458929; Tolerance: ±10%; Voltage Rating: 630V; Temperature Coefficient: X7R; RoHS: Yes; ComponentLink1Description: Datasheet; ComponentLink1URL: https://wmsc.lcsc.com/wmsc/upload/file/pdf/v2/lcsc/2304140030_Walsin-Tech-Corp-0805B822K631CT_C458929.pdf; ComponentLink2Description: JLCPCB Part URL; ComponentLink2URL: https://jlcpcb.com/partdetail/C458929; ComponentLink3Description: LCSC Part URL; ComponentLink3URL: https://lcsc.com/product-detail/Multilayer-Ceramic-Capacitors-MLCC---SMD-SMT_Walsin-Tech-Corp-Walsin-Tech-Corp-0805B822K631CT_C458929.html
footprint CAP-0805 (0805 (2012M) Capacitor)
pins: 1, 2

## 0805B823K500CT
designator C?  Capacitance: 82nF  (hidden comment: *)
Capacitor, Ceramic (MLCC), 82nF, ±10%, 50V, X7R, ±10%, SMD 0805; Manufacturer: Walsin Tech Corp; Manufacturer Part Number: 0805B823K500CT; Package Size: 0805; JLCPCB Basic Part: No; JLCPCB Part Number: C396736; Supplier 1: LCSC; Category: Capacitors - MLCC; Supplier Part Number 1: C396736; Tolerance: ±10%; Voltage Rating: 50V; Temperature Coefficient: X7R; RoHS: Yes; ComponentLink1Description: Datasheet; ComponentLink1URL: https://wmsc.lcsc.com/wmsc/upload/file/pdf/v2/lcsc/2304140030_Walsin-Tech-Corp-0805B823K500CT_C396736.pdf; ComponentLink2Description: JLCPCB Part URL; ComponentLink2URL: https://jlcpcb.com/partdetail/C396736; ComponentLink3Description: LCSC Part URL; ComponentLink3URL: https://lcsc.com/product-detail/Multilayer-Ceramic-Capacitors-MLCC---SMD-SMT_Walsin-Tech-Corp-Walsin-Tech-Corp-0805B823K500CT_C396736.html
footprint CAP-0805 (0805 (2012M) Capacitor)
pins: 1, 2

## 0805B823K500NT
designator C?  Capacitance: 82nF  (hidden comment: *)
Capacitor, Ceramic (MLCC), 82nF, ±10%, 50V, X7R, ±10%, SMD 0805; Manufacturer: FH (Guangdong Fenghua Advanced Tech); Manufacturer Part Number: 0805B823K500NT; Package Size: 0805; JLCPCB Basic Part: No; JLCPCB Part Number: C2991683; Supplier 1: LCSC; Category: Capacitors - MLCC; Supplier Part Number 1: C2991683; Tolerance: ±10%; Voltage Rating: 50V; Temperature Coefficient: X7R; RoHS: Yes; ComponentLink1Description: Datasheet; ComponentLink1URL: https://wmsc.lcsc.com/wmsc/upload/file/pdf/v2/lcsc/2204111630_FH--Guangdong-Fenghua-Advanced-Tech-0805B823K500NT_C2991683.pdf; ComponentLink2Description: JLCPCB Part URL; ComponentLink2URL: https://jlcpcb.com/partdetail/C2991683; ComponentLink3Description: LCSC Part URL; ComponentLink3URL: https://lcsc.com/product-detail/Multilayer-Ceramic-Capacitors-MLCC---SMD-SMT_FH-Guangdong-Fenghua-Advanced-Tech-FH-Guangdong-Fenghua-Advanced-Tech-0805B823K500NT_C2991683.html
footprint CAP-0805 (0805 (2012M) Capacitor)
pins: 1, 2

## 0805B824K100CT
designator C?  Capacitance: 820nF  (hidden comment: *)
Capacitor, Ceramic (MLCC), 820nF, ±10%, 10V, X7R, ±10%, SMD 0805; Manufacturer: Walsin Tech Corp; Manufacturer Part Number: 0805B824K100CT; Package Size: 0805; JLCPCB Basic Part: No; JLCPCB Part Number: C152860; Supplier 1: LCSC; Category: Capacitors - MLCC; Supplier Part Number 1: C152860; Tolerance: ±10%; Voltage Rating: 10V; Temperature Coefficient: X7R; RoHS: Yes; ComponentLink1Description: Datasheet; ComponentLink1URL: https://wmsc.lcsc.com/wmsc/upload/file/pdf/v2/lcsc/2304140030_Walsin-Tech-Corp-0805B824K100CT_C152860.pdf; ComponentLink2Description: JLCPCB Part URL; ComponentLink2URL: https://jlcpcb.com/partdetail/C152860; ComponentLink3Description: LCSC Part URL; ComponentLink3URL: https://lcsc.com/product-detail/Multilayer-Ceramic-Capacitors-MLCC---SMD-SMT_Walsin-Tech-Corp-Walsin-Tech-Corp-0805B824K100CT_C152860.html
footprint CAP-0805 (0805 (2012M) Capacitor)
pins: 1, 2